# Altium footprint library PcbLib_ICs_part2.PcbLib: 66 footprints (part 1 of 5)
Each footprint in its own frame and in the unit in brackets; x right, y up, seen from the top. Pads: shape width x height; smd on the part's side, far side on the other; paste and mask are expansions set on the pad; w line width, h text height; cw(c..) or ccw(c..) is an arc to the next point about the centre after c.
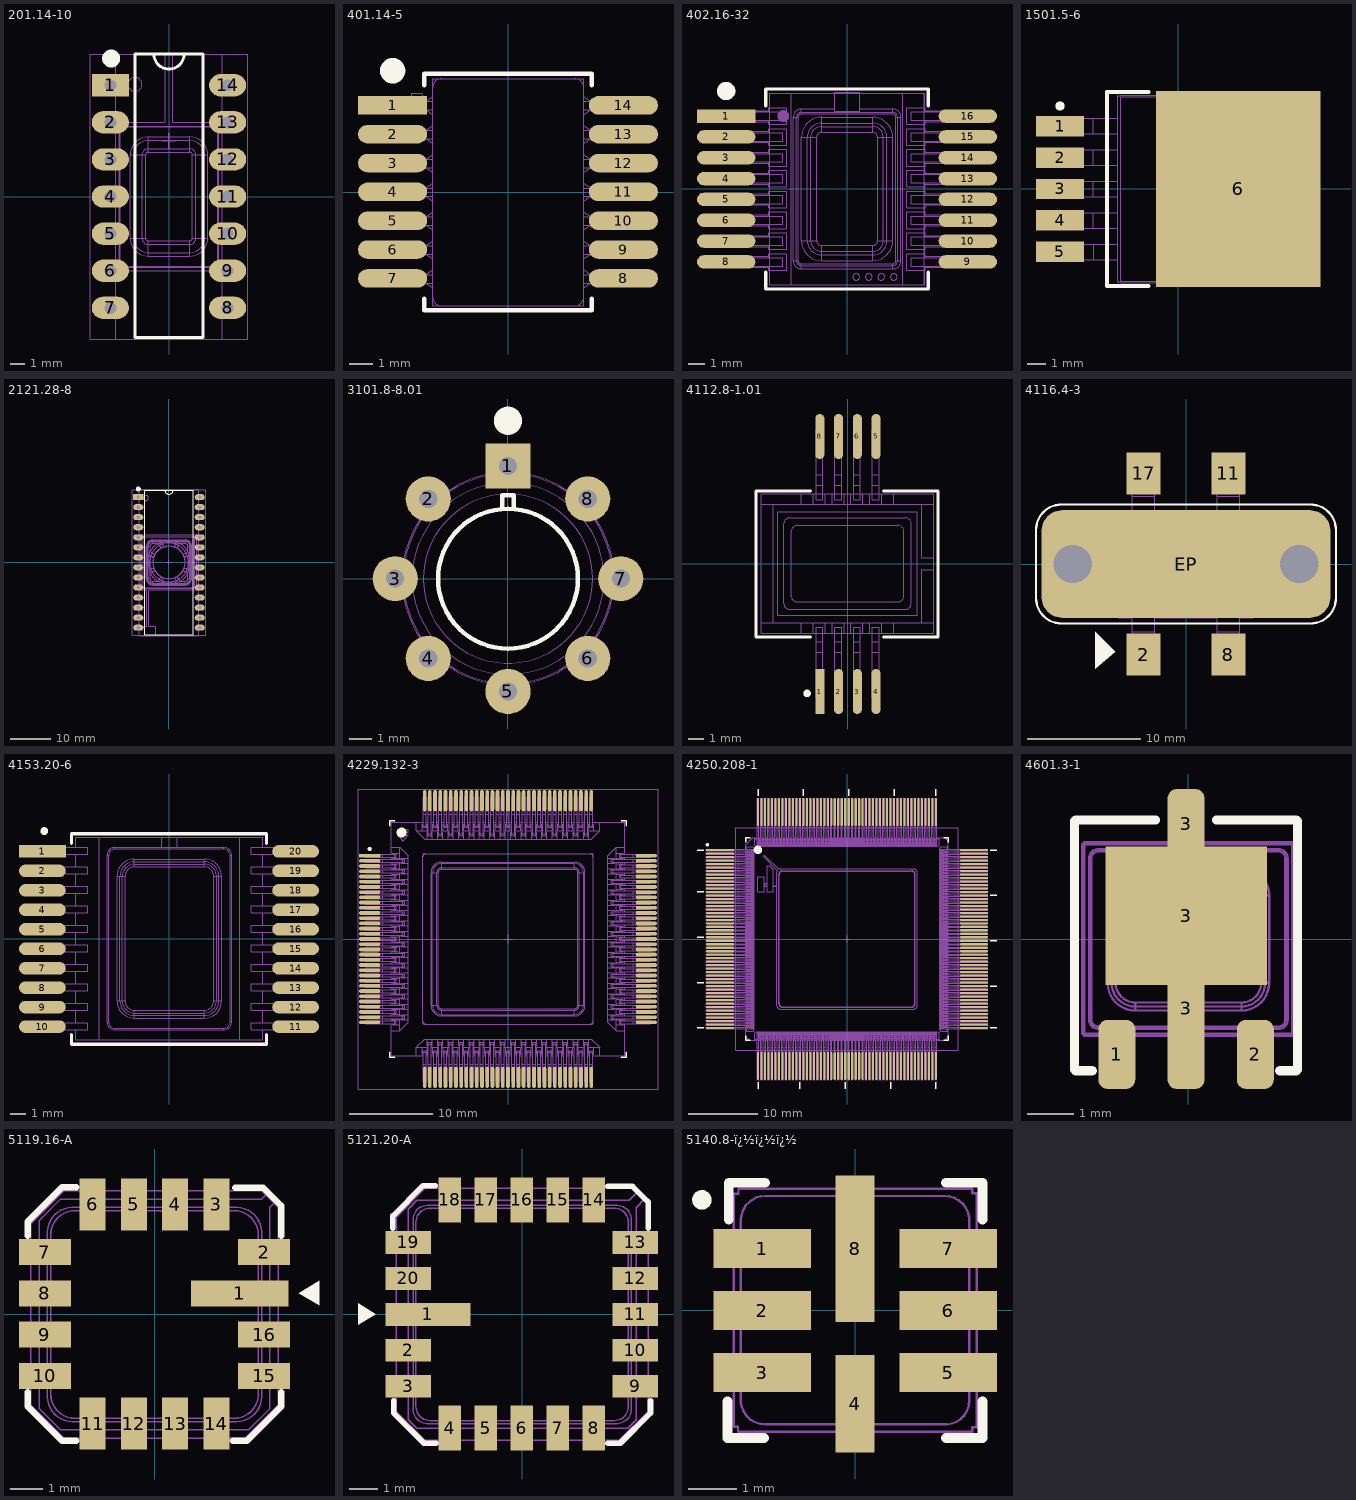
[diagram p0: the footprints below, top view; thin cyan lines are the x and y axes]

## 201.14-10 [mm]
height 1.75
pads (14):
  rect 2.5x1.5 hole 0.8 mask+0.075: 1(-3.95,7.5)
  oval 2.5x1.5 hole 0.8 mask+0.075: 2(-3.95,5) 3(-3.95,2.5) 4(-3.95,0) 5(-3.95,-2.5) 6(-3.95,-5) 7(-3.95,-7.5) 8(3.95,-7.5) 9(3.95,-5) 10(3.95,-2.5) 11(3.95,0) 12(3.95,2.5) 13(3.95,5) 14(3.95,7.5)
Top Overlay:
  circle w0.6: c-3.9,9.3 r0.3
  lines w0.2: -1.016,9.6 ccw(c0,9.6) 1.016,9.6 ; -2.3,-9.5 2.3,-9.5 2.3,9.6 -2.3,9.6 -2.3,-9.5
Top Assy:
  drawing of 172 lines, arcs and shapes, not listed
  text ".Designator" at 0.7,-5.162 h3
Top Text:
  lines w0.05: -5.3,-9.6 5.3,-9.6 5.3,9.6 -5.3,9.6 -5.3,-9.6
  lines w0.1: -0.5,3.75 0.5,3.75 ; 0,3.25 0,4.25
3D body "User Library-201.14-10.x_t": height 4.1, standoff -2.5, extent -3.901,-9.6 3.901,9.6

## 401.14-5 [mm]
pads (14):
  rect 3x0.8 smd paste+0 mask+0.05: 1(-5.005,3.766)
  oval 3x0.8 smd paste+0 mask+0.05: 2(-5.005,2.516) 3(-5.005,1.266) 4(-5.005,0.016) 5(-5.005,-1.234) 6(-5.005,-2.484) 7(-5.005,-3.734) 8(4.995,-3.734) 9(4.995,-2.484) 10(4.995,-1.234) 11(4.995,0.016) 12(4.995,1.266) 13(4.995,2.516) 14(4.995,3.766)
Top Overlay:
  circle w0.6: c-5.005,5.266 r0.25
  lines w0.2: -3.63,-4.609 -3.63,-5.109 3.62,-5.109 3.62,-4.609 ; -3.63,4.641 -3.63,5.141 3.62,5.141 3.62,4.641
Top Simple Assy:
  lines w0.05: -3.276,4.925 -3.276,-4.925 3.275,-4.927 ; -3.276,4.927 3.276,4.925 3.276,-4.927 ; -3.275,-3.934 -6.32,-3.934 -6.32,-3.569 -3.275,-3.569 ; -3.275,-2.683 -6.32,-2.683 -6.32,-2.318 -3.275,-2.318 ; -3.275,-1.433 -6.32,-1.433 -6.32,-1.068 -3.275,-1.068 ; -3.275,-0.183 -6.32,-0.183 -6.32,0.183 -3.275,0.183 ; -3.275,1.068 -6.32,1.068 -6.32,1.433 -3.275,1.433 ; -3.275,2.318 -6.32,2.318 -6.32,2.683 -3.275,2.683 ; -3.275,3.569 -6.32,3.569 -6.32,3.934 -4.166,3.934 -4.166,4.279 -3.766,4.279 -3.576,3.934 -3.275,3.934 ; 3.275,-3.934 6.32,-3.934 6.32,-3.569 3.275,-3.569 ; 3.275,-2.683 6.32,-2.683 6.32,-2.318 3.275,-2.318 ; 3.275,-1.433 6.32,-1.433 6.32,-1.068 3.275,-1.068 ; 3.275,-0.183 6.32,-0.183 6.32,0.183 3.275,0.183 ; 3.275,1.068 6.32,1.068 6.32,1.433 3.275,1.433 ; 3.275,2.318 6.32,2.318 6.32,2.683 3.275,2.683 ; 3.275,3.569 6.32,3.569 6.32,3.934 3.275,3.934
  text ".Designator" at -3.443,-0.467 h2
Top Assy:
  lines w0.05: -4.948,-3.934 -4.948,-3.569 ; -4.948,-2.683 -4.948,-2.318 ; -4.948,-1.433 -4.948,-1.068 ; -4.948,-0.183 -4.948,0.183 ; -4.948,1.068 -4.948,1.433 ; -4.948,2.318 -4.948,2.683 ; -4.948,3.569 -4.948,3.934 ; 4.948,-3.934 4.948,-3.569 ; 4.948,-2.683 4.948,-2.318 ; 4.948,-1.433 4.948,-1.068 ; 4.948,-0.183 4.948,0.183 ; 4.948,1.068 4.948,1.433 ; 4.948,2.318 4.948,2.683 ; 4.948,3.569 4.948,3.934 ; -3.576,-3.934 -3.276,-4.134 -3.276,-3.369 -3.576,-3.569 ; -3.576,-3.934 -3.576,-3.569 ; -3.576,-3.934 -3.576,-3.569 ; -3.576,-3.934 -6.32,-3.934 -6.32,-3.569 -3.576,-3.569 ; -3.576,-2.683 -3.276,-2.884 -3.276,-2.118 -3.576,-2.318 ; -3.576,-2.683 -3.576,-2.318 ; -3.576,-2.683 -3.576,-2.318 ; -3.576,-2.683 -6.32,-2.683 -6.32,-2.318 -3.576,-2.318 ; -3.576,-1.433 -3.276,-1.633 -3.276,-0.868 -3.576,-1.068 ; -3.576,-1.433 -3.576,-1.068 ; -3.576,-1.433 -3.576,-1.068 ; -3.576,-1.433 -6.32,-1.433 -6.32,-1.068 -3.576,-1.068 ; -3.576,-0.183 -3.576,0.183 ; -3.576,-0.183 -3.576,0.183 ; -3.576,-0.183 -3.276,-0.383 -3.276,0.383 -3.576,0.183 ; -3.576,-0.183 -6.32,-0.183 -6.32,0.183 -3.576,0.183 ; -3.576,1.068 -3.276,0.868 -3.276,1.633 -3.576,1.433 ; -3.576,1.068 -3.576,1.433 ; -3.576,1.068 -3.576,1.433 ; -3.576,1.068 -6.32,1.068 -6.32,1.433 -3.576,1.433 ; -3.576,2.318 -3.276,2.118 -3.276,2.884 -3.576,2.683 ; -3.576,2.318 -3.576,2.683 ; -3.576,2.318 -3.576,2.683 ; -3.576,2.318 -6.32,2.318 -6.32,2.683 -3.576,2.683 ; -3.576,3.569 -3.276,3.369 -3.276,4.134 -3.576,3.934 ; -3.576,3.569 -3.576,3.934 ; -3.576,3.569 -3.576,3.934 ; -3.576,3.569 -6.32,3.569 -6.32,3.934 -4.166,3.934 -4.166,4.279 -3.766,4.279 -3.576,3.934 ; 3.576,-3.934 3.276,-4.134 3.276,-3.369 3.576,-3.569 ; 3.576,-3.934 3.576,-3.569 ; 3.576,-3.934 3.576,-3.569 ; 3.576,-3.934 6.32,-3.934 6.32,-3.569 3.576,-3.569 ; 3.576,-2.683 3.276,-2.884 3.276,-2.118 3.576,-2.318 ; 3.576,-2.683 3.576,-2.318 ; 3.576,-2.683 3.576,-2.318 ; 3.576,-2.683 6.32,-2.683 6.32,-2.318 3.576,-2.318 ; 3.576,-1.433 3.276,-1.633 3.276,-0.868 3.576,-1.068 ; 3.576,-1.433 3.576,-1.068 ; 3.576,-1.433 3.576,-1.068 ; 3.576,-1.433 6.32,-1.433 6.32,-1.068 3.576,-1.068 ; 3.576,-0.183 3.576,0.183 ; 3.576,-0.183 3.576,0.183 ; 3.576,-0.183 3.276,-0.383 3.276,0.383 3.576,0.183 ; 3.576,-0.183 6.32,-0.183 6.32,0.183 3.576,0.183 ; 3.576,1.068 3.276,0.868 3.276,1.633 3.576,1.433 ; 3.576,1.068 3.576,1.433 ; 3.576,1.068 3.576,1.433 ; 3.576,1.068 6.32,1.068 6.32,1.433 3.576,1.433 ; 3.576,2.318 3.276,2.118 3.276,2.884 3.576,2.683 ; 3.576,2.318 3.576,2.683 ; 3.576,2.318 3.576,2.683 ; 3.576,2.318 6.32,2.318 6.32,2.683 3.576,2.683 ; 3.576,3.569 3.276,3.369 3.276,4.134 3.576,3.934 ; 3.576,3.569 3.576,3.934 ; 3.576,3.569 3.576,3.934 ; 3.576,3.569 6.32,3.569 6.32,3.934 3.576,3.934 ; -3.276,-4.527 ccw(c-2.876,-4.527) -2.876,-4.927 2.876,-4.927 ccw(c2.876,-4.527) 3.276,-4.527 3.276,4.527 ccw(c2.876,4.527) 2.876,4.927 -2.876,4.927 ccw(c-2.876,4.527) -3.276,4.527 -3.276,-4.527
  text ".Designator" at -3.443,-0.467 h2
Top Text:
  text ".Designator" at -3.443,-0.467 h2
3D body "User Library-401_14-5-129.STEP": height 1.4, standoff 0, extent -4.93,-4.959 4.97,5.041

## 402.16-32 [mm]
pads (16):
  rect 3.5x0.8 smd paste+0 mask+0.05: 1(-7.25,4.375)
  oval 3.5x0.8 smd paste+0 mask+0.05: 2(-7.25,3.125) 3(-7.25,1.875) 4(-7.25,0.625) 5(-7.25,-0.625) 6(-7.25,-1.875) 7(-7.25,-3.125) 8(-7.25,-4.375) 9(7.25,-4.375) 10(7.25,-3.125) 11(7.25,-1.875) 12(7.25,-0.625) 13(7.25,0.625) 14(7.25,1.875) 15(7.25,3.125) 16(7.25,4.375)
Top Overlay:
  circle w0.6: c-7.25,5.875 r0.25
  lines w0.2: -4.875,-5 -4.875,-6 4.875,-6 4.875,-5 ; -4.875,5 -4.875,6 4.875,6 4.875,5
Top Simple Assy:
  circle w0.5: c-3.825,4.375 r0.106
  lines w0.05: -4.625,-4.7 -8.125,-4.7 -8.125,-4.05 -4.625,-4.05 ; -4.625,-3.45 -8.125,-3.45 -8.125,-2.8 -4.625,-2.8 ; -4.625,-2.2 -8.125,-2.2 -8.125,-1.55 -4.625,-1.55 ; -4.625,-0.95 -8.125,-0.95 -8.125,-0.3 -4.625,-0.3 ; -4.625,0.3 -8.125,0.3 -8.125,0.95 -4.625,0.95 ; -4.625,1.55 -8.125,1.55 -8.125,2.2 -4.625,2.2 ; -4.625,2.8 -8.125,2.8 -8.125,3.45 -4.625,3.45 ; -4.625,4.05 -8.125,4.05 -8.125,4.7 -4.625,4.7 ; 4.625,-4.7 8.125,-4.7 8.125,-4.05 4.625,-4.05 ; 4.625,-3.45 8.125,-3.45 8.125,-2.8 4.625,-2.8 ; 4.625,-2.2 8.125,-2.2 8.125,-1.55 4.625,-1.55 ; 4.625,-0.95 8.125,-0.95 8.125,-0.3 4.625,-0.3 ; 4.625,0.3 8.125,0.3 8.125,0.95 4.625,0.95 ; 4.625,1.55 8.125,1.55 8.125,2.2 4.625,2.2 ; 4.625,2.8 8.125,2.8 8.125,3.45 4.625,3.45 ; 4.625,4.05 8.125,4.05 8.125,4.7 4.625,4.7 ; -4.625,-5.75 4.625,-5.75 4.625,5.75 -4.625,5.75 -4.625,-5.75
  text ".Designator" at -3.443,-0.467 h2
Top Assy:
  drawing of 420 lines, arcs and shapes, not listed
  text ".Designator" at -3.443,-0.467 h2
Top Text:
  text ".Designator" at -3.443,-0.467 h2
3D body "User Library-402_16-23.STEP": height 2.35, standoff 0, extent -8.05,-5.767 8.085,5.781

## 1501.5-6 [mm]
height 4.57
pads (6):
  rect 2.6x1.1 smd: 1(-6.4,3.4) 2(-6.4,1.7) 3(-6.4,0) 4(-6.4,-1.7) 5(-6.4,-3.4)
  rect 8.9x10.6 smd paste-10: 6(3.25,0)
Top Overlay:
  circle w0.25: c-6.4,4.5 r0.125
  lines w0.2: -1.6,-5.25 -3.85,-5.25 -3.85,5.25 -1.6,5.25
Top Paste:
  rectangle: -1,-5.1 0,-4.1
  rectangle: 0.233,-5.1 1.233,-4.1
  rectangle: 1.467,-5.1 2.467,-4.1
  rectangle: 2.7,-5.1 3.7,-4.1
  rectangle: 3.933,-5.1 4.933,-4.1
  rectangle: 5.167,-5.1 6.167,-4.1
  rectangle: 6.4,-5.1 7.4,-4.1
  rectangle: -1,-3.95 0,-2.95
  rectangle: -1,-2.8 0,-1.8
  rectangle: -1,-1.65 0,-0.65
  rectangle: -1,-0.5 0,0.5
  rectangle: -1,0.65 0,1.65
  rectangle: -1,1.8 0,2.8
  rectangle: -1,2.95 0,3.95
  rectangle: -1,4.1 0,5.1
  rectangle: 0.233,4.1 1.233,5.1
  rectangle: 0.233,2.95 1.233,3.95
  rectangle: 0.233,1.8 1.233,2.8
  rectangle: 0.233,0.65 1.233,1.65
  rectangle: 0.233,-0.5 1.233,0.5
  rectangle: 0.233,-1.65 1.233,-0.65
  rectangle: 0.233,-2.8 1.233,-1.8
  rectangle: 0.233,-3.95 1.233,-2.95
  rectangle: 1.467,4.1 2.467,5.1
  rectangle: 1.467,2.95 2.467,3.95
  rectangle: 1.467,1.8 2.467,2.8
  rectangle: 1.467,0.65 2.467,1.65
  rectangle: 1.467,-0.5 2.467,0.5
  rectangle: 1.467,-1.65 2.467,-0.65
  rectangle: 1.467,-2.8 2.467,-1.8
  rectangle: 1.467,-3.95 2.467,-2.95
  rectangle: 2.7,4.1 3.7,5.1
  rectangle: 2.7,2.95 3.7,3.95
  rectangle: 2.7,1.8 3.7,2.8
  rectangle: 2.7,0.65 3.7,1.65
  rectangle: 2.7,-0.5 3.7,0.5
  rectangle: 2.7,-1.65 3.7,-0.65
  rectangle: 2.7,-2.8 3.7,-1.8
  rectangle: 2.7,-3.95 3.7,-2.95
  rectangle: 3.933,4.1 4.933,5.1
  rectangle: 3.933,2.95 4.933,3.95
  rectangle: 3.933,1.8 4.933,2.8
  rectangle: 3.933,0.65 4.933,1.65
  rectangle: 3.933,-0.5 4.933,0.5
  rectangle: 3.933,-1.65 4.933,-0.65
  rectangle: 3.933,-2.8 4.933,-1.8
  rectangle: 3.933,-3.95 4.933,-2.95
  rectangle: 5.167,4.1 6.167,5.1
  rectangle: 5.167,2.95 6.167,3.95
  rectangle: 5.167,1.8 6.167,2.8
  rectangle: 5.167,0.65 6.167,1.65
  rectangle: 5.167,-0.5 6.167,0.5
  rectangle: 5.167,-1.65 6.167,-0.65
  rectangle: 5.167,-2.8 6.167,-1.8
  rectangle: 5.167,-3.95 6.167,-2.95
  rectangle: 6.4,4.1 7.4,5.1
  rectangle: 6.4,2.95 7.4,3.95
  rectangle: 6.4,1.8 7.4,2.8
  rectangle: 6.4,0.65 7.4,1.65
  rectangle: 6.4,-0.5 7.4,0.5
  rectangle: 6.4,-1.65 7.4,-0.65
  rectangle: 6.4,-2.8 7.4,-1.8
  rectangle: 6.4,-3.95 7.4,-2.95
Top Assy:
  lines w0.05: -3.303,-3.827 -4.598,-3.827 ; -3.303,-2.987 -4.598,-2.987 ; -3.303,-2.122 -4.598,-2.122 ; -3.303,-1.282 -4.598,-1.282 ; -3.303,-0.417 -4.598,-0.417 ; -3.303,0.423 -4.598,0.423 ; -3.303,1.288 -4.598,1.288 ; -3.303,2.128 -4.598,2.128 ; -3.303,2.993 -4.598,2.993 ; -3.303,3.833 -4.598,3.833 ; -6.648,-3.827 -7.413,-3.827 -7.413,-2.987 -6.648,-2.987 ; -6.648,-3.827 -6.648,-2.987 ; -6.648,-3.827 -5.928,-3.827 ; -6.648,-2.987 -5.928,-2.987 ; -6.648,-2.122 -7.413,-2.122 -7.413,-1.282 -6.648,-1.282 ; -6.648,-2.122 -6.648,-1.282 ; -6.648,-2.122 -5.928,-2.122 ; -6.648,-1.282 -5.928,-1.282 ; -6.648,-0.417 -7.413,-0.417 -7.413,0.423 -6.648,0.423 ; -6.648,-0.417 -6.648,0.423 ; -6.648,-0.417 -5.928,-0.417 ; -6.648,0.423 -5.928,0.423 ; -6.648,1.288 -7.413,1.288 -7.413,2.128 -6.648,2.128 ; -6.648,1.288 -6.648,2.128 ; -6.648,1.288 -5.928,1.288 ; -6.648,2.128 -5.928,2.128 ; -6.648,2.993 -7.413,2.993 -7.413,3.833 -6.648,3.833 ; -6.648,2.993 -6.648,3.833 ; -6.648,2.993 -5.928,2.993 ; -6.648,3.833 -5.928,3.833 ; -5.928,-3.827 -5.928,-2.987 ; -5.928,-3.827 -4.598,-3.827 ; -5.928,-2.987 -4.598,-2.987 ; -5.928,-2.122 -4.598,-2.122 ; -5.928,-2.122 -5.928,-1.282 ; -5.928,-1.282 -4.598,-1.282 ; -5.928,-0.417 -4.598,-0.417 ; -5.928,-0.417 -5.928,0.423 ; -5.928,0.423 -4.598,0.423 ; -5.928,1.288 -4.598,1.288 ; -5.928,1.288 -5.928,2.128 ; -5.928,2.128 -4.598,2.128 ; -5.928,2.993 -5.928,3.833 ; -5.928,2.993 -4.598,2.993 ; -5.928,3.833 -4.598,3.833 ; -4.598,-3.827 -4.598,-2.987 ; -4.598,-2.122 -4.598,-1.282 ; -4.598,-0.417 -4.598,0.423 ; -4.598,1.288 -4.598,2.128 ; -4.598,2.993 -4.598,3.833 ; -3.303,-5.022 -3.128,-4.998 ; -3.303,-5.022 -3.303,-5.032 -3.124,-5.077 5.332,-5.077 ; -3.303,-5.022 -3.303,5.028 ; -3.303,5.028 -3.128,5.004 ; -3.303,5.028 -3.303,5.038 -3.124,5.083 5.332,5.083 ; -3.128,-4.998 -3.128,5.004 ; -3.128,-4.998 4.93,-4.998 ; -3.128,5.004 4.93,5.004 ; 4.93,-4.998 5.332,-5.055 5.332,-3.807 ; 4.93,-4.998 4.93,5.004 ; 4.93,5.004 5.332,5.061 5.332,3.813 ; 5.332,-5.077 5.332,-3.807 ; 5.332,-5.077 6.252,-5.077 6.602,-3.769 6.602,3.775 6.252,5.083 5.332,5.083 ; 5.332,-3.807 5.332,3.813 ; 5.332,3.813 5.332,5.083
  text ".Designator" at -5.162,-0.7 h3
3D body "1501.5-6.STEP": height 4.57, standoff -0.01, extent -7.171,-5.08 7.47,5.08

## 2101.8-7 [mm]
height 1.75
pads (8):
  rect 2.5x1.5 hole 0.8 mask+0.075: 1(-3.95,3.75)
  oval 2.5x1.5 hole 0.8 mask+0.075: 2(-3.95,1.25) 3(-3.95,-1.25) 4(-3.95,-3.75) 5(3.95,-3.75) 6(3.95,-1.25) 7(3.95,1.25) 8(3.95,3.75)
Top Overlay:
  circle w0.6: c-4,5.75 r0.3
  lines w0.2: -1.016,4.8 ccw(c0,4.8) 1.016,4.8 ; -2.2,-4.8 2.2,-4.8 2.2,4.8 -2.2,4.8 -2.2,-4.8
Top Assy:
  drawing of 1352 lines, arcs and shapes, not listed
  text ".Designator" at 0.7,-5.162 h3
Top Text:
  lines w0.05: -5.334,-5 5.334,-5 5.334,5 -5.334,5 -5.334,-5
  lines w0.1: -0.5,0 0.5,0 ; 0,-0.5 0,0.5
3D body "2101.8-7.STEP": height 5.2, standoff -3.3, extent -3.95,-5 3.95,5.01

## 2121.28-8 [mm]
height 1.75
pads (28):
  rect 2.5x1.5 hole 0.8 mask+0.075: 1(-7.649,16.243)
  oval 2.5x1.5 hole 0.8 mask+0.075: 2(-7.649,13.743) 3(-7.649,11.243) 4(-7.649,8.743) 5(-7.649,6.243) 6(-7.649,3.743) 7(-7.649,1.243) 8(-7.649,-1.257) 9(-7.649,-3.757) 10(-7.649,-6.257) 11(-7.649,-8.757) 12(-7.649,-11.257) 13(-7.649,-13.757) 14(-7.649,-16.257) 15(7.653,-16.256) 16(7.653,-13.756) 17(7.653,-11.256) 18(7.653,-8.756) 19(7.653,-6.256) 20(7.653,-3.756) 21(7.653,-1.256) 22(7.653,1.244) 23(7.653,3.744) 24(7.653,6.244) 25(7.653,8.744) 26(7.653,11.244) 27(7.653,13.744) 28(7.653,16.244)
Top Overlay:
  circle w0.6: c-7.62,18.288 r0.3
  lines w0.2: -1.016,18 ccw(c0,18) 1.016,18 ; -6,-18 -6,18 6,18 6,-18 -6,-18
Top Assy:
  drawing of 958 lines, arcs and shapes, not listed
  text ".Designator" at 0.7,-5.162 h3
Top Text:
  lines w0.05: -9.1,-18.1 -9.1,18.1 9.1,18.1 9.1,-18.1 -9.1,-18.1
  lines w0.1: -0.5,0 0.5,0 ; 0,-0.5 0,0.5
3D body "2121.28-8.x_t": height 5.69, standoff -2.5, extent -7.651,-18.25 7.651,18.25

## 3101.8-8.01 [mm]
height 4.57
pads (8):
  rect 2x2 hole 0.8: 1(0,5)
  round 2 hole 0.8: 2(-3.536,3.536) 3(-5,0) 4(-3.536,-3.536) 5(0,-5) 6(3.536,-3.536) 7(5,0) 8(3.536,3.536)
Top Overlay:
  circle w0.2: c0,0 r3.1
  circle w0.65: c0,7 r0.3
  lines w0.2: -0.25,3.15 -0.25,3.7 0.25,3.7 0.25,3.15
Top Assy:
  drawing of 189 lines, arcs and shapes, not listed
  text ".Designator" at -5.162,-0.7 h3
3D body "3101.8-8.x_t": height 9.2, standoff -2.7, extent -5.225,-5.223 5.225,5.82

## 4112.8-1.01 [mm]
pads (8):
  rect 0.6x3 smd paste+0 mask+0.05: 1(-1.85,-8.525)
  oval 0.6x3 smd paste+0 mask+0.05: 2(-0.6,-8.525) 3(0.65,-8.525) 4(1.9,-8.525) 5(1.9,8.475) 6(0.65,8.475) 7(-0.6,8.475) 8(-1.85,8.475)
Top Overlay:
  circle w0.25: c-2.7,-8.65 r0.125
  lines w0.2: -2.475,-4.9 -6.1,-4.9 -6.1,4.85 -2.475,4.85 ; 2.4,-4.9 6.025,-4.9 6.025,4.85 2.4,4.85
Top Simple Assy:
  lines w0.05: -5.75,-3.95 5.75,-3.95 ; -5.75,3.95 5.75,3.95 ; -4.95,-3.95 -4.95,3.95 ; -2.1,-4.65 -2.1,-8.925 -1.65,-8.925 -1.65,-4.65 ; -2.1,4.65 -2.1,8.925 -1.65,8.925 -1.65,4.65 ; -0.85,-4.65 -0.85,-8.925 -0.4,-8.925 -0.4,-4.65 ; -0.85,4.65 -0.85,8.925 -0.4,8.925 -0.4,4.65 ; 0.4,-4.65 0.4,-8.925 0.85,-8.925 0.85,-4.65 ; 0.4,4.65 0.4,8.925 0.85,8.925 0.85,4.65 ; 1.65,-4.65 1.65,-8.925 2.1,-8.925 2.1,-4.65 ; 1.65,4.65 1.65,8.925 2.1,8.925 2.1,4.65 ; 2.275,-4.65 3.075,-4.65 ; 4.95,-3.95 4.95,-0.4 5.75,-0.4 ; 4.95,3.95 4.95,0.4 5.75,0.4 ; -5.75,-4.65 -5.75,4.65 5.75,4.65 5.75,-4.65 -5.75,-4.65
  text ".Designator" at -3.443,-0.467 h2
Top Assy:
  lines w0.05: -5.75,-3.95 5.75,-3.95 ; -5.75,3.95 5.75,3.95 ; -4.95,-3.95 -4.95,3.95 ; -2.1,-5.925 -1.65,-5.925 ; -2.1,-5.225 -1.65,-5.225 ; -2.1,5.225 -1.65,5.225 ; -2.1,5.925 -1.65,5.925 ; -0.85,-5.925 -0.4,-5.925 ; -0.85,-5.225 -0.4,-5.225 ; -0.85,5.225 -0.4,5.225 ; -0.85,5.925 -0.4,5.925 ; 0.4,-5.925 0.85,-5.925 ; 0.4,-5.225 0.85,-5.225 ; 0.4,5.225 0.85,5.225 ; 0.4,5.925 0.85,5.925 ; 1.65,-5.925 2.1,-5.925 ; 1.65,-5.225 2.1,-5.225 ; 1.65,5.225 2.1,5.225 ; 1.65,5.925 2.1,5.925 ; 4.95,-3.95 4.95,-0.4 5.75,-0.4 5.75,0.4 4.95,0.4 4.95,3.95 ; -2.275,-4.65 -3.075,-4.65 -3.075,-3.95 -2.275,-3.95 ; -2.275,-4.65 -2.275,-3.95 ; -2.275,-4.65 -2.275,-3.95 ; -2.275,-4.65 -1.475,-4.65 -1.475,-3.95 -2.275,-3.95 ; -2.275,3.95 -2.275,4.65 ; -2.275,3.95 -3.075,3.95 -3.075,4.65 -2.275,4.65 ; -2.275,3.95 -2.275,4.65 ; -2.275,3.95 -1.475,3.95 -1.475,4.65 -2.275,4.65 ; 2.275,-4.65 3.075,-4.65 3.075,-3.95 2.275,-3.95 ; 2.275,-4.65 2.275,-3.95 ; 2.275,-4.65 2.275,-3.95 ; 2.275,-4.65 1.475,-4.65 1.475,-3.95 2.275,-3.95 ; 2.275,3.95 3.075,3.95 3.075,4.65 2.275,4.65 ; 2.275,3.95 2.275,4.65 ; 2.275,3.95 2.275,4.65 ; 2.275,3.95 1.475,3.95 1.475,4.65 2.275,4.65 ; -5.75,-4.65 -5.75,4.65 5.75,4.65 5.75,-4.65 -5.75,-4.65 ; -4.65,-3.45 -4.65,3.45 4.65,3.45 4.65,-3.45 -4.65,-3.45 ; -4.25,-2.65 ccw(c-3.85,-2.65) -3.85,-3.05 3.85,-3.05 ccw(c3.85,-2.65) 4.25,-2.65 4.25,2.65 ccw(c3.85,2.65) 3.85,3.05 -3.85,3.05 ccw(c-3.85,2.65) -4.25,2.65 -4.25,-2.65 ; -3.75,-2.15 ccw(c-3.35,-2.15) -3.35,-2.55 3.35,-2.55 ccw(c3.35,-2.15) 3.75,-2.15 3.75,2.15 ccw(c3.35,2.15) 3.35,2.55 -3.35,2.55 ccw(c-3.35,2.15) -3.75,2.15 -3.75,-2.15 ; -2.1,-8.925 -2.1,-4.25 -1.65,-4.25 -1.65,-8.925 -2.1,-8.925 ; -2.1,4.25 -2.1,8.925 -1.65,8.925 -1.65,4.25 -2.1,4.25 ; -1.025,-4.65 -0.225,-4.65 -0.225,-3.95 -1.025,-3.95 -1.025,-4.65 ; -1.025,3.95 -0.225,3.95 -0.225,4.65 -1.025,4.65 -1.025,3.95 ; -0.85,-8.925 -0.4,-8.925 -0.4,-4.25 -0.85,-4.25 -0.85,-8.925 ; -0.85,4.25 -0.4,4.25 -0.4,8.925 -0.85,8.925 -0.85,4.25 ; 0.225,-4.65 1.025,-4.65 1.025,-3.95 0.225,-3.95 0.225,-4.65 ; 0.225,3.95 1.025,3.95 1.025,4.65 0.225,4.65 0.225,3.95 ; 0.4,-8.925 0.85,-8.925 0.85,-4.25 0.4,-4.25 0.4,-8.925 ; 0.4,4.25 0.85,4.25 0.85,8.925 0.4,8.925 0.4,4.25 ; 1.65,-8.925 2.1,-8.925 2.1,-4.25 1.65,-4.25 1.65,-8.925 ; 1.65,4.25 2.1,4.25 2.1,8.925 1.65,8.925 1.65,4.25
  text ".Designator" at -3.443,-0.467 h2
Top Text:
  text ".Designator" at -3.443,-0.467 h2
3D body "4112_8-1.STEP": height 2.65, standoff 0, extent -5.725,-8.1 5.775,8.035
